# Altium footprint library 逸芬的库鸭.PcbLib: 255 footprints (part 11 of 20) (continued)
## LOGO_琴 [mm] (continued)

## LOGO_电量显示 [mm]
Top Layer:
  lines w0.051: -2.794,-4.445 -2.235,-4.445 ; -2.794,-4.394 -2.286,-4.394 ; -2.794,-4.343 -2.286,-4.343 ; -2.794,-4.293 -2.286,-4.293 ; -2.794,-4.242 -2.286,-4.242 ; -2.794,-4.191 -2.286,-4.191 ; -2.794,-4.14 -2.286,-4.14 ; -2.794,-4.089 -2.286,-4.089 ; -2.794,-4.039 -2.286,-4.039 ; -2.794,-3.988 -2.286,-3.988 ; -2.794,-3.937 -2.286,-3.937 ; -2.794,-3.886 -2.286,-3.886 ; -2.794,-3.835 -2.286,-3.835 ; -2.794,-3.785 -2.286,-3.785 ; -2.794,-3.734 -2.286,-3.734 ; -2.794,-3.683 -2.286,-3.683 ; -2.794,-3.632 -2.286,-3.632 ; -2.794,-3.581 -2.286,-3.581 ; -2.794,-3.531 -2.286,-3.531 ; -2.794,-3.48 -2.286,-3.48 ; -2.794,-3.429 -2.286,-3.429 ; -2.794,-3.378 -2.286,-3.378 ; -2.794,-3.327 -2.286,-3.327 ; -2.794,-3.277 -2.286,-3.277 ; -2.794,-3.226 -2.286,-3.226 ; -2.794,-3.175 -2.286,-3.175 ; -2.794,-3.124 -2.286,-3.124 ; -2.794,-3.073 -2.286,-3.073 ; -2.794,-3.023 -2.286,-3.023 ; -2.794,-2.972 -2.286,-2.972 ; -2.794,-2.921 -2.286,-2.921 ; -2.794,-2.87 -2.286,-2.87 ; -2.794,-2.819 -2.286,-2.819 ; -2.794,-2.769 -2.286,-2.769 ; -2.794,-2.718 -2.286,-2.718 ; -2.794,-2.667 -2.286,-2.667 ; -2.794,-2.616 -2.286,-2.616 ; -2.794,-2.565 -2.286,-2.565 ; -2.794,-2.515 -2.286,-2.515 ; -2.794,-2.464 -2.286,-2.464 ; -2.794,-2.413 -2.286,-2.413 ; -2.794,-2.362 -2.286,-2.362 ; -2.794,-2.311 -2.286,-2.311 ; -2.794,-2.261 -2.286,-2.261 ; -2.794,-2.21 -2.286,-2.21 ; -2.794,-2.159 -2.286,-2.159 ; -2.794,-2.108 -2.286,-2.108 ; -2.794,-2.057 -2.286,-2.057 ; -2.794,-2.007 -2.286,-2.007 ; -2.794,-1.956 -2.286,-1.956 ; -2.794,-1.905 -2.286,-1.905 ; -2.794,-1.854 -2.286,-1.854 ; -2.794,-1.803 -2.286,-1.803 ; -2.794,-1.753 -2.286,-1.753 ; -2.794,-1.702 -2.286,-1.702 ; -2.794,-1.651 -2.286,-1.651 ; -2.794,-1.6 -2.286,-1.6 ; -2.794,-1.549 -2.286,-1.549 ; -2.794,-1.499 -2.286,-1.499 ; -2.794,-1.448 -2.286,-1.448 ; -2.794,-1.397 -2.286,-1.397 ; -2.794,-1.346 -2.286,-1.346 ; -2.794,-1.295 -2.286,-1.295 ; -2.794,-1.245 -2.286,-1.245 ; -2.794,-1.194 -2.286,-1.194 ; -2.794,-1.143 -2.286,-1.143 ; -2.794,-1.092 -2.286,-1.092 ; -2.794,-1.041 -2.286,-1.041 ; -2.794,-0.991 -2.286,-0.991 ; -2.794,-0.94 -2.286,-0.94 ; -2.794,-0.889 -2.286,-0.889 ; -2.794,-0.838 -2.286,-0.838 ; -2.794,-0.787 -2.286,-0.787 ; -2.794,-0.737 -2.286,-0.737 ; -2.794,-0.686 -2.286,-0.686 ; -2.794,-0.635 -2.286,-0.635 ; -2.794,-0.584 -2.286,-0.584 ; -2.794,-0.533 -2.286,-0.533 ; -2.794,-0.483 -2.286,-0.483 ; -2.794,-0.432 -2.286,-0.432 ; -2.794,-0.381 -2.286,-0.381 ; -2.794,-0.33 -2.286,-0.33 ; -2.794,-0.279 -2.286,-0.279 ; -2.794,-0.229 -2.286,-0.229 ; -2.794,-0.178 -2.286,-0.178 ; -2.794,-0.127 -2.286,-0.127 ; -2.794,-0.076 -2.286,-0.076 ; -2.794,-0.025 -2.286,-0.025 ; -2.794,0.025 -2.286,0.025 ; -2.794,0.076 -2.286,0.076 ; -2.794,0.127 -2.286,0.127 ; -2.794,0.178 -2.286,0.178 ; -2.794,0.229 -2.286,0.229 ; -2.794,0.279 -2.286,0.279 ; -2.794,0.33 -2.286,0.33 ; -2.794,0.381 -2.286,0.381 ; -2.794,0.432 -2.286,0.432 ; -2.794,0.483 -2.286,0.483 ; -2.794,0.533 -2.286,0.533 ; -2.794,0.584 -2.286,0.584 ; -2.794,0.635 -2.286,0.635 ; -2.794,0.686 -2.286,0.686 ; -2.794,0.737 -2.286,0.737 ; -2.794,0.787 -2.286,0.787 ; -2.794,0.838 -2.286,0.838 ; -2.794,0.889 -2.286,0.889 ; -2.794,0.94 -2.286,0.94 ; -2.794,0.991 -2.286,0.991 ; -2.794,1.041 -2.286,1.041 ; -2.794,1.092 -2.286,1.092 ; -2.794,1.143 -2.286,1.143 ; -2.794,1.194 -2.286,1.194 ; -2.794,1.245 -2.286,1.245 ; -2.794,1.295 -2.286,1.295 ; -2.794,1.346 -2.286,1.346 ; -2.794,1.397 -2.286,1.397 ; -2.794,1.448 -2.286,1.448 ; -2.794,1.499 -2.286,1.499 ; -2.794,1.549 -2.286,1.549 ; -2.794,1.6 -2.286,1.6 ; -2.794,1.651 -2.286,1.651 ; -2.794,1.702 -2.286,1.702 ; -2.794,1.753 -2.286,1.753 ; -2.794,1.803 -2.286,1.803 ; -2.794,1.854 -2.286,1.854 ; -2.794,1.905 -2.286,1.905 ; -2.794,1.956 -2.286,1.956 ; -2.794,2.007 -2.286,2.007 ; -2.794,2.057 -2.286,2.057 ; -2.794,2.108 -2.286,2.108 ; -2.794,2.159 -2.286,2.159 ; -2.794,2.21 -2.286,2.21 ; -2.794,2.261 -2.286,2.261 ; -2.794,2.311 -2.286,2.311 ; -2.794,2.362 -2.286,2.362 ; -2.794,2.413 -2.286,2.413 ; -2.794,2.464 -2.286,2.464 ; -2.794,2.515 -2.286,2.515 ; -2.794,2.565 -2.286,2.565 ; -2.794,2.616 -2.286,2.616 ; -2.794,2.667 -2.286,2.667 ; -2.794,2.718 -2.286,2.718 ; -2.794,2.769 -2.286,2.769 ; -2.794,2.819 -2.286,2.819 ; -2.794,2.87 -2.286,2.87 ; -2.794,2.921 -2.286,2.921 ; -2.794,2.972 -2.286,2.972 ; -2.794,3.023 -2.286,3.023 ; -2.794,3.073 -2.286,3.073 ; -2.794,3.124 -2.286,3.124 ; -2.794,3.175 -2.286,3.175 ; -2.794,3.226 -2.286,3.226 ; -2.794,3.277 -2.286,3.277 ; -2.794,3.327 -2.286,3.327 ; -2.794,3.378 -2.286,3.378 ; -2.794,3.429 -2.286,3.429 ; -2.794,3.48 -2.286,3.48 ; -2.794,3.531 -2.286,3.531 ; -2.794,3.581 -2.235,3.581 ; -2.743,-4.597 -2.083,-4.597 ; -2.743,-4.547 -2.134,-4.547 ; -2.743,-4.496 -2.184,-4.496 ; -2.743,3.632 -2.184,3.632 ; -2.743,3.683 -2.134,3.683 ; -2.692,-4.699 2.489,-4.699 ; -2.692,-4.648 -1.93,-4.648 ; -2.692,3.734 -2.083,3.734 ; -2.692,3.785 -1.88,3.785 ; -2.642,-4.75 2.489,-4.75 ; -2.642,3.835 2.489,3.835 ; -2.642,3.886 2.438,3.886 ; -2.591,-4.801 2.438,-4.801 ; -2.591,3.937 2.388,3.937 ; -2.54,-4.902 2.337,-4.902 ; -2.54,-4.851 2.388,-4.851 ; -2.54,3.988 2.388,3.988 ; -2.489,4.039 2.337,4.039 ; -2.438,-4.953 2.286,-4.953 ; -2.438,4.089 2.235,4.089 ; -2.388,-5.004 2.184,-5.004 ; -2.388,4.14 2.184,4.14 ; -2.286,-5.055 2.134,-5.055 ; -2.286,4.191 2.083,4.191 ; -2.184,-5.105 2.032,-5.105 ; -2.134,4.242 1.981,4.242 ; -1.981,-4.293 1.829,-4.293 ; -1.981,-4.242 1.829,-4.242 ; -1.981,-4.191 1.829,-4.191 ; -1.981,-4.14 1.829,-4.14 ; -1.981,-4.089 1.829,-4.089 ; -1.981,-4.039 1.829,-4.039 ; -1.981,-3.988 1.829,-3.988 ; -1.981,-3.937 1.829,-3.937 ; -1.981,-3.886 1.829,-3.886 ; -1.981,-3.835 1.829,-3.835 ; -1.981,-3.785 1.829,-3.785 ; -1.981,-3.734 1.829,-3.734 ; -1.981,-3.683 1.829,-3.683 ; -1.981,-3.632 1.829,-3.632 ; -1.981,-3.581 1.829,-3.581 ; -1.981,-3.531 1.829,-3.531 ; -1.981,-3.48 1.829,-3.48 ; -1.981,-3.429 1.829,-3.429 ; -1.981,-3.378 1.829,-3.378 ; -1.981,-3.327 1.829,-3.327 ; -1.981,-3.277 1.829,-3.277 ; -1.981,-3.226 1.829,-3.226 ; -1.981,-3.175 1.829,-3.175 ; -1.981,-3.124 1.829,-3.124 ; -1.981,-3.073 1.829,-3.073 ; -1.981,-2.667 1.829,-2.667 ; -1.981,-2.616 1.829,-2.616 ; -1.981,-2.565 1.829,-2.565 ; -1.981,-2.515 1.829,-2.515 ; -1.981,-2.464 1.829,-2.464 ; -1.981,-2.413 1.829,-2.413 ; -1.981,-2.362 1.829,-2.362 ; -1.981,-2.311 1.829,-2.311 ; -1.981,-2.261 1.829,-2.261 ; -1.981,-2.21 1.829,-2.21 ; -1.981,-2.159 1.829,-2.159 ; -1.981,-2.108 1.829,-2.108 ; -1.981,-2.057 1.829,-2.057 ; -1.981,-2.007 1.829,-2.007 ; -1.981,-1.956 1.829,-1.956 ; -1.981,-1.905 1.829,-1.905 ; -1.981,-1.854 1.829,-1.854 ; -1.981,-1.803 1.829,-1.803 ; -1.981,-1.753 1.829,-1.753 ; -1.981,-1.702 1.829,-1.702 ; -1.981,-1.651 1.829,-1.651 ; -1.981,-1.6 1.829,-1.6 ; -1.981,-1.549 1.829,-1.549 ; -1.981,-1.499 1.829,-1.499 ; -1.981,-1.448 1.829,-1.448 ; -1.981,-1.041 1.829,-1.041 ; -1.981,-0.991 1.829,-0.991 ; -1.981,-0.94 1.829,-0.94 ; -1.981,-0.889 1.829,-0.889 ; -1.981,-0.838 1.829,-0.838 ; -1.981,-0.787 1.829,-0.787 ; -1.981,-0.737 1.829,-0.737 ; -1.981,-0.686 1.829,-0.686 ; -1.981,-0.635 1.829,-0.635 ; -1.981,-0.584 1.829,-0.584 ; -1.981,-0.533 1.829,-0.533 ; -1.981,-0.483 1.829,-0.483 ; -1.981,-0.432 1.829,-0.432 ; -1.981,-0.381 1.829,-0.381 ; -1.981,-0.33 1.829,-0.33 ; -1.981,-0.279 1.829,-0.279 ; -1.981,-0.229 1.829,-0.229 ; -1.981,-0.178 1.829,-0.178 ; -1.981,-0.127 1.829,-0.127 ; -1.981,-0.076 1.829,-0.076 ; -1.981,-0.025 1.829,-0.025 ; -1.981,0.025 1.829,0.025 ; -1.981,0.076 1.829,0.076 ; -1.981,0.127 1.829,0.127 ; -1.981,0.178 1.829,0.178 ; -1.981,0.635 1.829,0.635 ; -1.981,0.686 1.829,0.686 ; -1.981,0.737 1.829,0.737 ; -1.981,0.787 1.829,0.787 ; -1.981,0.838 1.829,0.838 ; -1.981,0.889 1.829,0.889 ; -1.981,0.94 1.829,0.94 ; -1.981,0.991 1.829,0.991 ; -1.981,1.041 1.829,1.041 ; -1.981,1.092 1.829,1.092 ; -1.981,1.143 1.829,1.143 ; -1.981,1.194 1.829,1.194 ; -1.981,1.245 1.829,1.245 ; -1.981,1.295 1.829,1.295 ; -1.981,1.346 1.829,1.346 ; -1.981,1.397 1.829,1.397 ; -1.981,1.448 1.829,1.448 ; -1.981,1.499 1.829,1.499 ; -1.981,1.549 1.829,1.549 ; -1.981,1.6 1.829,1.6 ; -1.981,1.651 1.829,1.651 ; -1.981,1.702 1.829,1.702 ; -1.981,1.753 1.829,1.753 ; -1.981,1.803 1.829,1.803 ; -1.981,1.854 1.829,1.854 ; -1.016,4.293 0.813,4.293 ; -1.016,4.343 0.813,4.343 ; -0.965,4.394 0.813,4.394 ; -0.965,4.445 0.813,4.445 ; -0.965,4.496 0.762,4.496 ; -0.914,4.547 0.711,4.547 ; -0.864,4.597 0.711,4.597 ; -0.813,4.648 0.61,4.648 ; -0.66,4.699 0.508,4.699 ; 1.676,3.785 2.489,3.785 ; 1.778,-4.648 2.54,-4.648 ; 1.88,-4.597 2.54,-4.597 ; 1.88,3.734 2.54,3.734 ; 1.981,-4.547 2.54,-4.547 ; 1.981,3.683 2.54,3.683 ; 2.032,-4.496 2.591,-4.496 ; 2.032,3.581 2.591,3.581 ; 2.032,3.632 2.591,3.632 ; 2.083,-4.445 2.591,-4.445 ; 2.083,-4.394 2.591,-4.394 ; 2.083,-4.343 2.591,-4.343 ; 2.083,3.48 2.591,3.48 ; 2.083,3.531 2.591,3.531 ; 2.134,-4.293 2.591,-4.293 ; 2.134,-4.242 2.591,-4.242 ; 2.134,-4.191 2.591,-4.191 ; 2.134,-4.14 2.591,-4.14 ; 2.134,-4.089 2.591,-4.089 ; 2.134,-4.039 2.591,-4.039 ; 2.134,-3.988 2.591,-3.988 ; 2.134,-3.937 2.591,-3.937 ; 2.134,-3.886 2.591,-3.886 ; 2.134,-3.835 2.591,-3.835 ; 2.134,-3.785 2.591,-3.785 ; 2.134,-3.734 2.591,-3.734 ; 2.134,-3.683 2.591,-3.683 ; 2.134,-3.632 2.591,-3.632 ; 2.134,-3.581 2.591,-3.581 ; 2.134,-3.531 2.591,-3.531 ; 2.134,-3.48 2.591,-3.48 ; 2.134,-3.429 2.591,-3.429 ; 2.134,-3.378 2.591,-3.378 ; 2.134,-3.327 2.591,-3.327 ; 2.134,-3.277 2.591,-3.277 ; 2.134,-3.226 2.591,-3.226 ; 2.134,-3.175 2.591,-3.175 ; 2.134,-3.124 2.591,-3.124 ; 2.134,-3.073 2.591,-3.073 ; 2.134,-3.023 2.591,-3.023 ; 2.134,-2.972 2.591,-2.972 ; 2.134,-2.921 2.591,-2.921 ; 2.134,-2.87 2.591,-2.87 ; 2.134,-2.819 2.591,-2.819 ; 2.134,-2.769 2.591,-2.769 ; 2.134,-2.718 2.591,-2.718 ; 2.134,-2.667 2.591,-2.667 ; 2.134,-2.616 2.591,-2.616 ; 2.134,-2.565 2.591,-2.565 ; 2.134,-2.515 2.591,-2.515 ; 2.134,-2.464 2.591,-2.464 ; 2.134,-2.413 2.591,-2.413 ; 2.134,-2.362 2.591,-2.362 ; 2.134,-2.311 2.591,-2.311 ; 2.134,-2.261 2.591,-2.261 ; 2.134,-2.21 2.591,-2.21 ; 2.134,-2.159 2.591,-2.159 ; 2.134,-2.108 2.591,-2.108 ; 2.134,-2.057 2.591,-2.057 ; 2.134,-2.007 2.591,-2.007 ; 2.134,-1.956 2.591,-1.956 ; 2.134,-1.905 2.591,-1.905 ; 2.134,-1.854 2.591,-1.854 ; 2.134,-1.803 2.591,-1.803 ; 2.134,-1.753 2.591,-1.753 ; 2.134,-1.702 2.591,-1.702 ; 2.134,-1.651 2.591,-1.651 ; 2.134,-1.6 2.591,-1.6 ; 2.134,-1.549 2.591,-1.549 ; 2.134,-1.499 2.591,-1.499 ; 2.134,-1.448 2.591,-1.448 ; 2.134,-1.397 2.591,-1.397 ; 2.134,-1.346 2.591,-1.346 ; 2.134,-1.295 2.591,-1.295 ; 2.134,-1.245 2.591,-1.245 ; 2.134,-1.194 2.591,-1.194 ; 2.134,-1.143 2.591,-1.143 ; 2.134,-1.092 2.591,-1.092 ; 2.134,-1.041 2.591,-1.041 ; 2.134,-0.991 2.591,-0.991 ; 2.134,-0.94 2.591,-0.94 ; 2.134,-0.889 2.591,-0.889 ; 2.134,-0.838 2.591,-0.838 ; 2.134,-0.787 2.591,-0.787 ; 2.134,-0.737 2.591,-0.737 ; 2.134,-0.686 2.591,-0.686 ; 2.134,-0.635 2.591,-0.635 ; 2.134,-0.584 2.591,-0.584 ; 2.134,-0.533 2.591,-0.533 ; 2.134,-0.483 2.591,-0.483 ; 2.134,-0.432 2.591,-0.432 ; 2.134,-0.381 2.591,-0.381 ; 2.134,-0.33 2.591,-0.33 ; 2.134,-0.279 2.591,-0.279 ; 2.134,-0.229 2.591,-0.229 ; 2.134,-0.178 2.591,-0.178 ; 2.134,-0.127 2.591,-0.127 ; 2.134,-0.076 2.591,-0.076 ; 2.134,-0.025 2.591,-0.025 ; 2.134,0.025 2.591,0.025 ; 2.134,0.076 2.591,0.076 ; 2.134,0.127 2.591,0.127 ; 2.134,0.178 2.591,0.178 ; 2.134,0.229 2.591,0.229 ; 2.134,0.279 2.591,0.279 ; 2.134,0.33 2.591,0.33 ; 2.134,0.381 2.591,0.381 ; 2.134,0.432 2.591,0.432 ; 2.134,0.483 2.591,0.483 ; 2.134,0.533 2.591,0.533 ; 2.134,0.584 2.591,0.584 ; 2.134,0.635 2.591,0.635 ; 2.134,0.686 2.591,0.686 ; 2.134,0.737 2.591,0.737 ; 2.134,0.787 2.591,0.787 ; 2.134,0.838 2.591,0.838 ; 2.134,0.889 2.591,0.889 ; 2.134,0.94 2.591,0.94 ; 2.134,0.991 2.591,0.991 ; 2.134,1.041 2.591,1.041 ; 2.134,1.092 2.591,1.092 ; 2.134,1.143 2.591,1.143 ; 2.134,1.194 2.591,1.194 ; 2.134,1.245 2.591,1.245 ; 2.134,1.295 2.591,1.295 ; 2.134,1.346 2.591,1.346 ; 2.134,1.397 2.591,1.397 ; 2.134,1.448 2.591,1.448 ; 2.134,1.499 2.591,1.499 ; 2.134,1.549 2.591,1.549 ; 2.134,1.6 2.591,1.6 ; 2.134,1.651 2.591,1.651 ; 2.134,1.702 2.591,1.702 ; 2.134,1.753 2.591,1.753 ; 2.134,1.803 2.591,1.803 ; 2.134,1.854 2.591,1.854 ; 2.134,1.905 2.591,1.905 ; 2.134,1.956 2.591,1.956 ; 2.134,2.007 2.591,2.007 ; 2.134,2.057 2.591,2.057 ; 2.134,2.108 2.591,2.108 ; 2.134,2.159 2.591,2.159 ; 2.134,2.21 2.591,2.21 ; 2.134,2.261 2.591,2.261 ; 2.134,2.311 2.591,2.311 ; 2.134,2.362 2.591,2.362 ; 2.134,2.413 2.591,2.413 ; 2.134,2.464 2.591,2.464 ; 2.134,2.515 2.591,2.515 ; 2.134,2.565 2.591,2.565 ; 2.134,2.616 2.591,2.616 ; 2.134,2.667 2.591,2.667 ; 2.134,2.718 2.591,2.718 ; 2.134,2.769 2.591,2.769 ; 2.134,2.819 2.591,2.819 ; 2.134,2.87 2.591,2.87 ; 2.134,2.921 2.591,2.921 ; 2.134,2.972 2.591,2.972 ; 2.134,3.023 2.591,3.023 ; 2.134,3.073 2.591,3.073 ; 2.134,3.124 2.591,3.124 ; 2.134,3.175 2.591,3.175 ; 2.134,3.226 2.591,3.226 ; 2.134,3.277 2.591,3.277 ; 2.134,3.327 2.591,3.327 ; 2.134,3.378 2.591,3.378 ; 2.134,3.429 2.591,3.429

## LQ_KEAP80SYSVK [mm]
pads (76):
  rect 1.6x1.6 hole 0.9: 1(-18.016,-19.342) 39(-18.016,13.678)
  round 1.6 hole 0.9: 2(-18.016,-16.802) 3(-15.476,-19.342) 4(-15.476,-16.802) 5(-12.936,-19.342) 6(-12.936,-16.802) 7(-10.396,-19.342) 8(-10.396,-16.802) 9(-7.856,-19.342) 10(-7.856,-16.802) 11(-5.316,-19.342) 12(-5.316,-16.802) 13(-2.776,-19.342) 14(-2.776,-16.802) 15(-0.236,-19.342) 16(-0.236,-16.802) 17(2.304,-19.342) 18(2.304,-16.802) 19(4.844,-19.342) 20(4.844,-16.802) 21(7.384,-19.342) 22(7.384,-16.802) 23(9.924,-19.342) 24(9.924,-16.802) 25(12.464,-19.342) 26(12.464,-16.802) 27(15.004,-19.342) 28(15.004,-16.802) 29(17.544,-19.342) 30(17.544,-16.802) 31(20.084,-19.342) 32(20.084,-16.802) 33(22.624,-19.342) 34(22.624,-16.802) 35(25.164,-19.342) 36(25.164,-16.802) 37(27.704,-19.342) 38(27.704,-16.802) 40(-18.016,16.218) 41(-15.476,13.678) 42(-15.476,16.218) 43(-12.936,13.678) 44(-12.936,16.218) 45(-10.396,13.678) 46(-10.396,16.218) 47(-7.856,13.678) 48(-7.856,16.218) 49(-5.316,13.678) 50(-5.316,16.218) 51(-2.776,13.678) 52(-2.776,16.218) 53(-0.236,13.678) 54(-0.236,16.218) 55(2.304,13.678) 56(2.304,16.218) 57(4.844,13.678) 58(4.844,16.218) 59(7.384,13.678) 60(7.384,16.218) 61(9.924,13.678) 62(9.924,16.218) 63(12.464,13.678) 64(12.464,16.218) 65(15.004,13.678) 66(15.004,16.218) 67(17.544,13.678) 68(17.544,16.218) 69(20.084,13.678) 70(20.084,16.218) 71(22.624,13.678) 72(22.624,16.218) 73(25.164,13.678) 74(25.164,16.218) 75(27.704,13.678) 76(27.704,16.218)
Top Overlay:
  lines w0.2: -20.208,16.739 -20.208,-19.905 ccw(c-18.208,-19.905) -18.208,-21.905 28.292,-21.905 ccw(c28.292,-19.905) 30.292,-19.905 30.292,16.739 ccw(c28.292,16.739) 28.292,18.739 -18.208,18.739 ; -20.158,16.749 cw(c-18.158,16.749) -18.158,18.749
  text "B1" at -18.618,-21.521 h1
  text "B2" at -18.788,17.289 h1
  text "F4" at -16.148,17.289 h1
  text "F6" at -13.708,17.289 h1
  text "H3" at -10.988,17.289 h1
  text "C0" at -8.568,17.289 h1
  text "I5" at -5.878,17.319 h1
  text "D5" at -3.488,17.289 h1
  text "D7" at -0.878,17.289 h1
  text "B5" at 4.142,17.289 h1
  text "E6" at 6.772,17.289 h1
  text "H1" at 9.232,17.289 h1
  text "I1" at 11.962,17.289 h1
  text "B6" at 14.192,17.289 h1
  text "H5" at 19.252,17.289 h1
  text "H7" at 21.872,17.289 h1
  text "D1" at 24.532,17.289 h1
  text "5V" at 27.052,17.289 h1
  text "GND" at -19.328,11.429 h1
  text "B3" at -16.128,11.399 h1
  text "F5" at -13.568,11.389 h1
  text "F7" at -11.138,11.389 h1
  text "H4" at -8.408,11.399 h1
  text "C1" at -5.988,11.399 h1
  text "I6" at -3.308,11.429 h1
  text "D6" at -0.858,11.399 h1
  text "C2" at 1.552,11.379 h1
  text "B4" at 4.162,11.399 h1
  text "E5" at 6.772,11.389 h1
  text "H0" at 9.222,11.399 h1
  text "I0" at 11.872,11.389 h1
  text "I4" at 14.442,11.389 h1
  text "B7" at 16.722,11.399 h1
  text "E7" at 19.392,11.389 h1
  text "H6" at 21.952,11.399 h1
  text "D0" at 24.192,11.399 h1
  text "GND" at 26.512,11.399 h1
  text "B0" at -18.758,-15.641 h1
  text "F2" at -16.208,-15.641 h1
  text "A6" at -13.768,-15.641 h1
  text "G7" at -11.048,-15.641 h1
  text "G5" at -8.488,-15.641 h1
  text "F1" at -5.798,-15.641 h1
  text "D4" at -3.548,-15.641 h1
  text "D2" at -0.938,-15.641 h1
  text "A2" at 1.602,-15.641 h1
  text "A0" at 4.082,-15.641 h1
  text "C6" at 6.472,-15.641 h1
  text "I2" at 9.212,-15.641 h1
  text "E2" at 11.642,-15.641 h1
  text "G2" at 14.132,-15.641 h1
  text "G0" at 16.642,-15.641 h1
  text "E0" at 19.192,-15.641 h1
  text "C4" at 21.652,-15.641 h1
  text "A4" at 24.212,-15.641 h1
  text "GND" at 26.532,-15.641 h1
  text "F3" at -16.208,-21.561 h1
  text "A7" at -13.768,-21.561 h1
  text "E4" at -11.048,-21.561 h1
  text "G6" at -8.488,-21.561 h1
  text "G4" at -6.068,-21.561 h1
  text "F0" at -3.428,-21.561 h1
  text "D3" at -0.938,-21.561 h1
  text "A3" at 1.602,-21.561 h1
  text "A1" at 4.082,-21.561 h1
  text "C7" at 6.472,-21.561 h1
  text "I3" at 9.352,-21.561 h1
  text "E3" at 11.882,-21.551 h1
  text "G3" at 14.132,-21.561 h1
  text "G1" at 16.902,-21.561 h1
  text "E1" at 19.482,-21.551 h1
  text "C5" at 21.822,-21.561 h1
  text "A5" at 24.322,-21.561 h1
  text "5V" at 26.992,-21.561 h1
  text "H2" at 16.702,17.289 h1
  text "C3" at 1.522,17.289 h1
  text "+" at 28.762,15.579 h1.5
  text "-" at 28.752,-17.401 h1.5
  text "+" at 28.742,-19.901 h1.5
  text "-" at 28.752,13.039 h1.5

## LQFP-48 [mm]
pads (48):
  oval 2.1x0.3 smd: 1(-4.1,2.75) 2(-4.1,2.25) 3(-4.1,1.75) 4(-4.1,1.25) 5(-4.1,0.75) 6(-4.1,0.25) 7(-4.1,-0.25) 8(-4.1,-0.75) 9(-4.1,-1.25) 10(-4.1,-1.75) 11(-4.1,-2.25) 12(-4.1,-2.75) 25(4.1,-2.75) 26(4.1,-2.25) 27(4.1,-1.75) 28(4.1,-1.25) 29(4.1,-0.75) 30(4.1,-0.25) 31(4.1,0.25) 32(4.1,0.75) 33(4.1,1.25) 34(4.1,1.75) 35(4.1,2.25) 36(4.1,2.75)
  oval 0.3x2.1 smd: 13(-2.75,-4.1) 14(-2.25,-4.1) 15(-1.75,-4.1) 16(-1.25,-4.1) 17(-0.75,-4.1) 18(-0.25,-4.1) 19(0.25,-4.1) 20(0.75,-4.1) 21(1.25,-4.1) 22(1.75,-4.1) 23(2.25,-4.1) 24(2.75,-4.1) 37(2.75,4.1) 38(2.25,4.1) 39(1.75,4.1) 40(1.25,4.1) 41(0.75,4.1) 42(0.25,4.1) 43(-0.25,4.1) 44(-0.75,4.1) 45(-1.25,4.1) 46(-1.75,4.1) 47(-2.25,4.1) 48(-2.75,4.1)
Top Overlay:
  circle w0.6: c-1.725,1.725 r0.3
  circle w0.25: c-4.1,3.45 r0.125
  lines w0.2: -2.65,-2.65 -2.65,2.025 -2.025,2.65 2.65,2.65 2.65,-2.65 -2.65,-2.65
Mechanical 13:
  circle w0.1: c-2.6,2.6 r0.5
  lines w0.1: -3.5,-3.5 3.5,-3.5 3.5,3.5 -3.5,3.5 -3.5,-3.5
Mechanical 15:
  lines w0.1: -0.5,0 0.5,0 ; 0,-0.5 0,0.5